# Altium footprint library Lib_001.PcbLib: 429 footprints (part 19 of 28)
Each footprint in its own frame and in the unit in brackets; x right, y up, seen from the top. Pads: shape width x height; smd on the part's side, far side on the other; paste and mask are expansions set on the pad; w line width, h text height; cw(c..) or ccw(c..) is an arc to the next point about the centre after c.
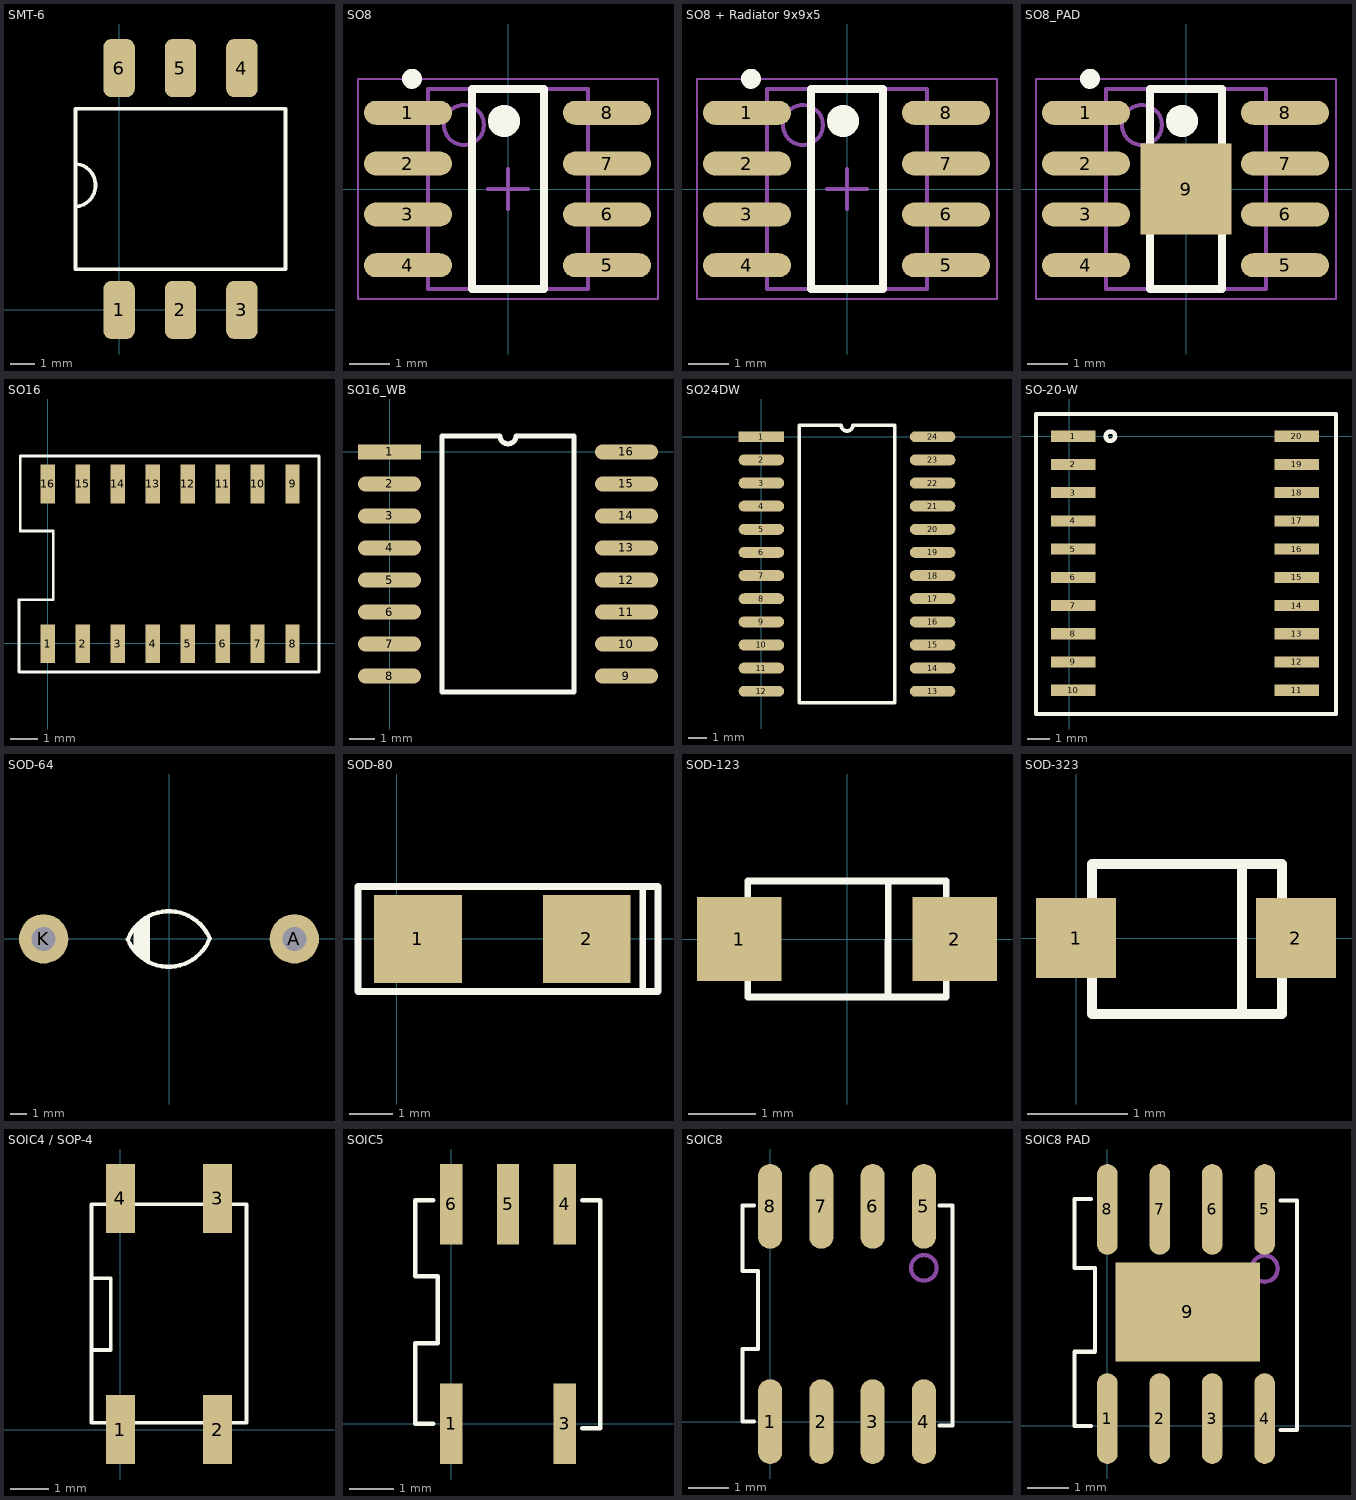
[diagram p18: the footprints below, top view; thin cyan lines are the x and y axes]

## SMT-6 [mm]
height 2
pads (6):
  rrect50% 1.3x2.4 smd: 1(0,0) 2(2.54,0) 3(5.08,0) 4(5.08,10) 5(2.54,10) 6(0,10)
Top Overlay:
  lines w0.15: -1.77,4.27 ccw(c-1.86,5.156) -1.76,6.04 ; -1.8,1.68 -1.8,8.32 6.88,8.32 6.88,1.68 -1.8,1.68
3D body "User Library-6-SMD.step": height 3.61, standoff 0, extent -1.125,0.05 6.165,10.21

## SO8 [mm] "SOIC, 8-Leads, Body 4.9x3.9mm, Pitch 1.27mm, IPC Medium Density"
height 1.75
pads (8):
  oval 2.2x0.6 smd: 1(-2.502,1.905) 2(-2.502,0.635) 3(-2.502,-0.635) 4(-2.502,-1.905) 5(2.476,-1.905) 6(2.476,-0.635) 7(2.476,0.635) 8(2.476,1.905)
Top Overlay:
  circle w0.4: c-0.1,1.7 r0.2
  circle w0.25: c-2.4,2.755 r0.125
  lines w0.2: -0.9,-2.5 0.9,-2.5 0.9,2.5 -0.9,2.5 -0.9,-2.5
Mechanical 13:
  circle w0.1: c-1.1,1.6 r0.5
  lines w0.1: -2,-2.5 2,-2.5 2,2.5 -2,2.5 -2,-2.5
Mechanical 15:
  lines w0.05: -3.75,-2.75 3.75,-2.75 3.75,2.75 -3.75,2.75 -3.75,-2.75
  lines w0.1: -0.5,0 0.5,0 ; 0,-0.5 0,0.5
3D body "User Library-SOIC-8-1.STEP": height 1.75, standoff 0, extent -2.981,-2.455 3.018,2.445

## SO8 + Radiator 9х9х5 [mm] "SOIC, 8-Leads, Body 4.9x3.9mm, Pitch 1.27mm, IPC Medium Density"
height 1.75
pads (8):
  oval 2.2x0.6 smd: 1(-2.502,1.905) 2(-2.502,0.635) 3(-2.502,-0.635) 4(-2.502,-1.905) 5(2.476,-1.905) 6(2.476,-0.635) 7(2.476,0.635) 8(2.476,1.905)
Top Overlay:
  circle w0.25: c-2.4,2.755 r0.125
  circle w0.4: c-0.1,1.7 r0.2
  lines w0.2: -0.9,-2.5 -0.9,2.5 0.9,2.5 0.9,-2.5 -0.9,-2.5
Mechanical 13:
  circle w0.1: c-1.1,1.6 r0.5
  lines w0.1: -2,-2.5 -2,2.5 2,2.5 2,-2.5 -2,-2.5
Mechanical 15:
  lines w0.05: -3.75,-2.75 -3.75,2.75 3.75,2.75 3.75,-2.75 -3.75,-2.75
  lines w0.1: -0.5,0 0.5,0 ; 0,-0.5 0,0.5
3D body "Радиатор 9х9х5.stp": height 6.8, standoff 1.8, extent -4.5,-4.5 4.5,4.5
3D body "User Library-SOIC-8-1.STEP": height 1.75, standoff 0, extent -2.981,-2.455 3.018,2.445

## SO8_PAD [mm] "SOIC, 8-Leads, Body 4.9x3.9mm, Pitch 1.27mm, IPC Medium Density"
height 1.75
pads (9):
  oval 2.2x0.6 smd: 1(-2.502,1.905) 2(-2.502,0.635) 3(-2.502,-0.635) 4(-2.502,-1.905) 5(2.476,-1.905) 6(2.476,-0.635) 7(2.476,0.635) 8(2.476,1.905)
  rect 2.28x2.28 smd: 9(0,0)
Top Overlay:
  circle w0.4: c-0.1,1.7 r0.2
  circle w0.25: c-2.4,2.755 r0.125
  lines w0.2: -0.9,-2.5 0.9,-2.5 0.9,2.5 -0.9,2.5 -0.9,-2.5
Mechanical 13:
  circle w0.1: c-1.1,1.6 r0.5
  lines w0.1: -2,-2.5 2,-2.5 2,2.5 -2,2.5 -2,-2.5
Mechanical 15:
  lines w0.05: -3.75,-2.75 3.75,-2.75 3.75,2.75 -3.75,2.75 -3.75,-2.75
  lines w0.1: -0.5,0 0.5,0 ; 0,-0.5 0,0.5
3D body "User Library-SOIC-8-1.STEP": height 1.75, standoff 0, extent -2.981,-2.455 3.018,2.445

## SO16 [mm]
pads (16):
  rect 0.52x1.4 smd: 1(0,-0.02) 2(1.27,-0.02) 3(2.54,-0.02) 4(3.81,-0.02) 5(5.08,-0.02) 6(6.35,-0.02) 7(7.62,-0.02) 8(8.89,-0.02) 9(8.89,5.78) 10(7.62,5.78) 11(6.35,5.78) 12(5.08,5.78) 13(3.81,5.78) 14(2.54,5.78) 15(1.27,5.78) 16(0,5.78)
Top Overlay:
  lines w0.102: -1.042,-1.05 9.85,-1.05 9.85,6.8 -1,6.8 -1,4.077 0.2,4.077 0.2,1.579 -1.042,1.579 -1.042,-1.05
3D body "SOP16.STEP": height 1.75, standoff 0, extent -1.015,-0.152 9.875,6.048

## SO16_WB [mm] "16-Lead SOIC (wide body)"
pads (16):
  rect 2.5x0.6 smd: 1(0,0)
  oval 2.5x0.6 smd: 2(0,-1.27) 3(0,-2.54) 4(0,-3.81) 5(0,-5.08) 6(0,-6.35) 7(0,-7.62) 8(0,-8.89) 9(9.4,-8.89) 10(9.4,-7.62) 11(9.4,-6.35) 12(9.4,-5.08) 13(9.4,-3.81) 14(9.4,-2.54) 15(9.4,-1.27) 16(9.4,0)
Top Overlay:
  lines w0.2: 2.085,-9.525 7.315,-9.525 7.315,0.635 5.017,0.635 cw(c4.7,0.635) 4.382,0.635 2.085,0.635 2.085,-9.525
3D body "m16b.stp": height 2.44, standoff -0.1, extent -0.584,-9.601 9.703,0.66

## SO24DW [mm]
height 3
pads (24):
  rect 2.5x0.6 smd: 1(0,0)
  oval 2.5x0.6 smd: 2(0,-1.27) 3(0,-2.54) 4(0,-3.81) 5(0,-5.08) 6(0,-6.35) 7(0,-7.62) 8(0,-8.89) 9(0,-10.16) 10(0,-11.43) 11(0,-12.7) 12(0,-13.97) 13(9.4,-13.97) 14(9.4,-12.7) 15(9.4,-11.43) 16(9.4,-10.16) 17(9.4,-8.89) 18(9.4,-7.62) 19(9.4,-6.35) 20(9.4,-5.08) 21(9.4,-3.81) 22(9.4,-2.54) 23(9.4,-1.27) 24(9.4,0)
Top Overlay:
  lines w0.2: 2.085,-14.605 7.315,-14.605 7.315,0.635 5.017,0.635 cw(c4.7,0.635) 4.382,0.635 2.085,0.635 2.085,-14.605
3D body "User Library-SO24.STEP": height 2.65, standoff 0, extent -0.652,-14.787 9.948,0.813

## SO-20-W [mm]
height 2.4
pads (20):
  rect 2x0.5 smd: 1(0.17,0) 2(0.17,-1.27) 3(0.17,-2.54) 4(0.17,-3.81) 5(0.17,-5.08) 6(0.17,-6.35) 7(0.17,-7.62) 8(0.17,-8.89) 9(0.17,-10.16) 10(0.17,-11.43) 11(10.23,-11.43) 12(10.23,-10.16) 13(10.23,-8.89) 14(10.23,-7.62) 15(10.23,-6.35) 16(10.23,-5.08) 17(10.23,-3.81) 18(10.23,-2.54) 19(10.23,-1.27) 20(10.23,0)
Top Overlay:
  lines w0.2: 2.055,0.03 ccw(c1.845,0) 2.057,-0.014 ; -1.5,-12.5 -1.5,1 12,1 12,-12.5 -1.5,-12.5
3D body "User Library-SOIC_20-300.STEP": height 2.6, standoff 0, extent -0.05,-12.02 10.35,0.58

## SOD-64 [mm]
pads (2):
  round 3 hole 1.45: A(7.62,0) K(-7.62,0)
Top Overlay:
  lines w0.254: -2.508,-0.035 ccw(c-0.025,0.991) 2.467,-0.011 ; -2.492,-0.004 cw(c0,-1.006) 2.482,0.019 ; -1.448,-1.143 -1.448,1.168 ; -1.27,-1.397 -1.27,1.321
  lines w1: -1.651,-0.635 -1.651,0.584
3D body "User Library-SOD64.step": height 3.82, standoff -3, extent -8.295,-1.813 8.295,1.813

## SOD-80 [mm]
height 3
pads (2):
  rect 2x2 smd: 1(0.49,0) 2(4.34,0)
Top Overlay:
  lines w0.15: -0.88,-1.2 -0.88,1.199
  lines w0.152: -0.88,-1.2 5.97,-1.2 5.97,1.199 -0.88,1.199 ; 5.624,-1.2 5.624,1.18
3D body "User Library-MiniMelf-2.step": height 1.6, standoff 0, extent 0.57,-0.78 4.27,0.82

## SOD-123 [mm]
height 1.4
pads (2):
  rect 1.25x1.25 smd: 1(-1.6,0) 2(1.6,0)
Top Overlay:
  lines w0.1: -1.473,-0.508 -1.473,-0.86 1.473,-0.86 1.473,-0.508 ; -1.473,0.508 -1.473,0.86 1.473,0.86 1.473,0.508 ; 0.61,-0.86 0.61,0.86
3D body "SW3DPS-SOD123-DEFAULT.STEP": height 1.28, standoff 0.01, extent -1.85,-0.8 1.85,0.8

## SOD-323 [mm]
height 1.11
pads (2):
  rect 0.8x0.8 smd: 1(0,0) 2(2.2,0)
Top Overlay:
  lines w0.1: 1.66,-0.75 1.66,0.73 ; 0.16,-0.76 0.16,-0.01 0.16,0.74 2.06,0.74 2.06,-0.01 2.06,-0.76 0.16,-0.76
3D body "User Library-SOD-323.step": height 1.1, standoff 0, extent -0.18,-0.675 2.42,0.675

## SOIC4 / SOP-4 [mm]
height 2
pads (4):
  rect 0.76x1.8 smd: 1(0,0) 2(2.54,0) 3(2.54,6.05) 4(0,6.05)
Top Overlay:
  lines w0.1: -0.762,2.085 -0.254,2.085 -0.254,3.024 -0.254,3.962 -0.762,3.962 ; -0.381,0.18 -0.762,0.18 -0.762,5.895 -0.381,5.895 ; 0.381,0.18 2.159,0.18 ; 0.381,5.895 2.159,5.895 ; 2.921,0.18 3.302,0.18 3.302,5.895 2.921,5.895
3D body "User Library-HCPL-181-1.STEP": height 2.11, standoff 0.01, extent -0.51,-0.46 3.09,6.54

## SOIC5 [mm]
height 2
pads (5):
  rect 0.5x1.8 smd: 1(0,0) 3(2.54,0) 4(2.54,4.9) 5(1.27,4.9) 6(0,4.9)
Top Overlay:
  lines w0.1: -0.4,0 -0.799,0 -0.799,1.798 -0.3,1.798 -0.3,3.297 -0.799,3.297 -0.799,4.995 -0.4,4.995 ; 2.926,-0.1 3.326,-0.1 3.326,4.995 2.926,4.995

## SOIC8 [mm]
height 2
pads (8):
  oval 0.6x2.1 smd: 1(0,0) 2(1.27,0) 3(2.54,0) 4(3.81,0) 5(3.81,5.334) 6(2.54,5.334) 7(1.27,5.334) 8(0,5.334)
Top Overlay:
  lines w0.1: -0.4,0 -0.686,0 -0.686,1.798 -0.3,1.798 -0.3,3.734 -0.686,3.734 -0.686,5.359 -0.4,5.359 ; 4.196,-0.1 4.521,-0.1 4.521,5.359 4.196,5.359
Mechanical 3:
  lines w0.102: 3.492,3.81 cw(c3.81,3.81) 3.81,4.127 cw(c3.81,3.81) 4.127,3.81 cw(c3.81,3.81) 3.81,3.492 cw(c3.81,3.81) 3.492,3.81
3D body "User Library-SOIC-8-1.STEP": height 1.75, standoff 0, extent -0.545,-0.307 4.355,5.693

## SOIC8 PAD [mm]
height 2
pads (9):
  oval 0.5x2.2 smd: 1(0,0.178) 2(1.27,0.178) 3(2.54,0.178) 4(3.81,0.178) 5(3.81,5.246) 6(2.54,5.246) 7(1.27,5.246) 8(0,5.246)
  rect 3.5x2.4 smd: 9(1.949,2.765)
Top Overlay:
  lines w0.1: -0.4,0 -0.799,0 -0.799,1.798 -0.3,1.798 -0.3,3.823 -0.799,3.823 -0.799,5.499 -0.4,5.499 ; 4.196,-0.1 4.596,-0.1 4.596,5.461 4.196,5.461
Mechanical 3:
  lines w0.102: 3.492,3.81 cw(c3.81,3.81) 3.81,4.127 cw(c3.81,3.81) 4.127,3.81 cw(c3.81,3.81) 3.81,3.492 cw(c3.81,3.81) 3.492,3.81
3D body "User Library-SOIC-8-1.STEP": height 1.75, standoff 0, extent -0.53,-0.23 4.37,5.77